# Altium footprint library picoprint_library.PcbLib: 102 footprints (part 3 of 7)
Each footprint in its own frame and in the unit in brackets; x right, y up, seen from the top. Pads: shape width x height; smd on the part's side, far side on the other; paste and mask are expansions set on the pad; w line width, h text height; cw(c..) or ccw(c..) is an arc to the next point about the centre after c.
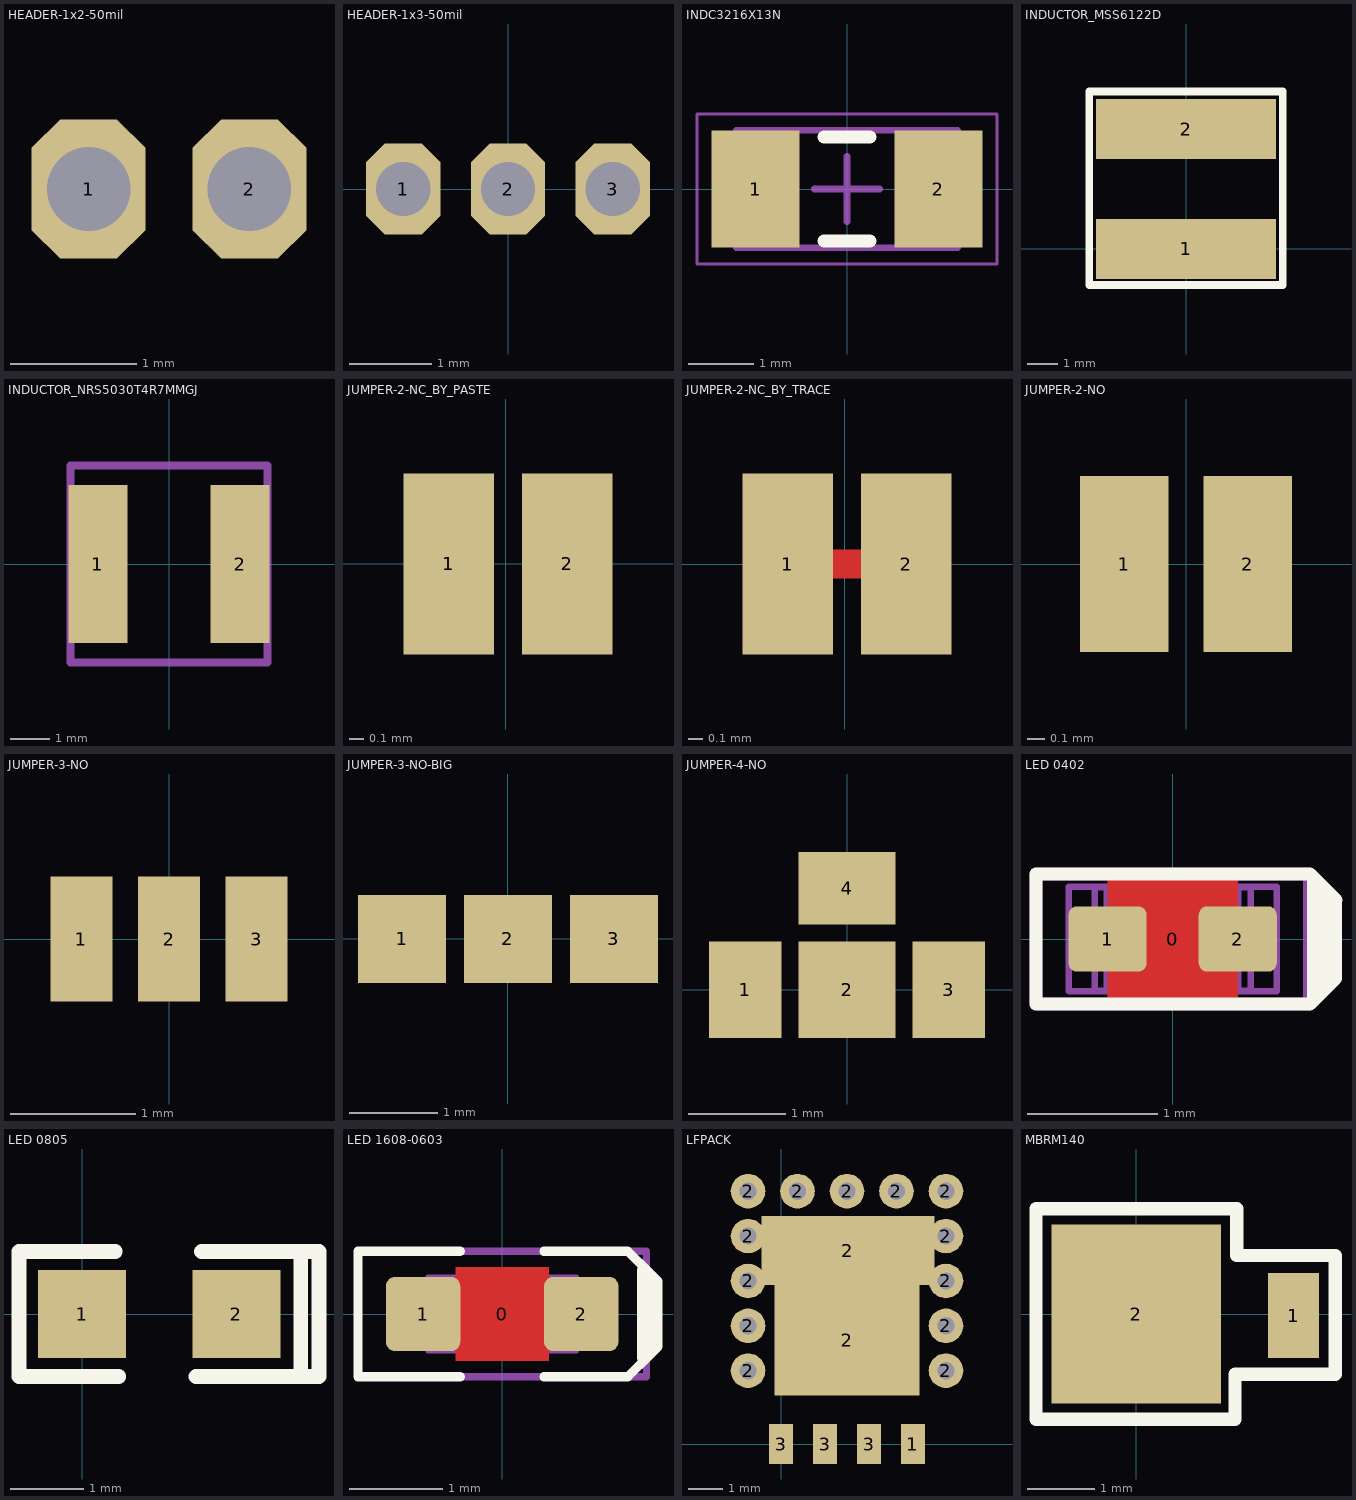
[diagram p2: the footprints below, top view; thin cyan lines are the x and y axes]

## HEADER-1x2-50mil [mm]
pads (2):
  oct 0.9x1.1 hole 0.66: 1(302.26,-308.61) 2(303.53,-308.61)
3D body "User Library-PinHeader1_27_2.STEP": height 5, standoff -2.3, extent 301.625,-309.81 304.165,-307.41

## HEADER-1x3-50mil [mm]
pads (3):
  oct 0.9x1.1 hole 0.66: 1(-1.27,0) 2(0,0) 3(1.27,0)
3D body "User Library-PinHeader1_27_2.STEP": height 5, standoff -2.3, extent -0.635,-1.2 1.905,1.2
3D body "User Library-PinHeader1_27_2.STEP": height 5, standoff -2.3, extent -1.905,-1.2 0.635,1.2

## INDC3216X13N [mm] ", 2-Leads, Body 3.20x1.60mm, IPC Medium Density"
height 1.3
pads (2):
  rect 1.35x1.8 smd: 1(-1.4,0) 2(1.4,0)
Top Overlay:
  lines w0.2: -0.35,-0.8 0.35,-0.8 ; -0.35,0.8 0.35,0.8
Mechanical 13:
  lines w0.1: -1.7,-0.9 -1.7,0.9 1.7,0.9 1.7,-0.9 -1.7,-0.9
Mechanical 15:
  lines w0.05: -2.3,-1.15 -2.3,1.15 2.3,1.15 2.3,-1.15 -2.3,-1.15
  lines w0.1: -0.5,0 0.5,0 ; 0,-0.5 0,0.5
3D body "INDC3216X13N.step": height 0, standoff 0, extent 0,0 0,0
3D body "RES 1206 (3216 metric).STEP": height 0.69, standoff -0.01, extent -1.625,-0.825 1.625,0.825

## INDUCTOR_MSS6122D [mm]
pads (2):
  rect 6x2 smd: 1(0,0) 2(0,4)
Top Overlay:
  lines w0.254: -3.225,-1.2 3.225,-1.2 3.225,5.25 -3.225,5.25 -3.225,-1.2

## INDUCTOR_NRS5030T4R7MMGJ [mm]
height 3.1
pads (2):
  rect 1.5x4 smd: 1(-1.8,0) 2(1.8,0)
Mechanical 13:
  lines w0.2: -2.5,-2.5 -2.5,2.5 2.5,2.5 2.5,-2.5 -2.5,-2.5
3D body "User Library-SMDpowerInductor.step": height 3, standoff 0, extent -2.4,-2.45 2.5,2.45

## JUMPER-2-NC_BY_PASTE [mil]
height 86.61
pads (2):
  rect 25x50 smd: 1(-15.78,0) 2(17,0)
Top Paste:
  rectangle: -40,-40 40,40

## JUMPER-2-NC_BY_TRACE [mil]
height 86.61
pads (2):
  rect 25x50 smd: 1(-15.78,0) 2(17,0)
Top Layer:
  rectangle: -3.94,-3.94 7.87,3.94

## JUMPER-2-NO [mm]
height 2.2
pads (2):
  rect 0.5x1 smd: 1(-0.35,0) 2(0.35,0)
Top Solder:
  rectangle: -0.1,-0.6 0.1,0.6

## JUMPER-3-NO [mm]
height 2.2
pads (3):
  rect 0.5x1 smd: 1(-0.7,0) 2(0,0) 3(0.7,0)

## JUMPER-3-NO-BIG [mm]
height 2.2
pads (3):
  rect 1x1 smd: 1(-1.2,0) 2(0,0) 3(1.2,0)

## JUMPER-4-NO [mm]
height 2.2
pads (4):
  rect 0.75x1 smd: 1(-1.05,0) 3(1.05,0)
  rect 1x1 smd: 2(0,0)
  rect 1x0.75 smd: 4(0,1.05)

## LED 0402 [mm]
pads (3):
  round 0.254 on Mech15: 0(0,0)
  rrect25% 0.6x0.5 smd: 1(-0.5,0) 2(0.5,0)
Top Layer:
  pour cut-out: -0.5,0.5 0.5,0.5 0.5,-0.5 -0.5,-0.5
Top Overlay:
  lines w0.1: 1.081,-0.474 1.081,0.474 1.16,0.395 ; 1.16,-0.36 1.16,0.395 ; 1.25,-0.245 1.25,0.245 1.25,0.305 1.16,0.395 ; 1.25,-0.13 1.25,-0.305 1.055,-0.5 -1.05,-0.5 -1.05,0.5 1.055,0.5 1.255,0.3
Mechanical 13:
  lines w0.05: -0.6,-0.4 -0.6,0.399 0.6,0.4 0.6,-0.4 -0.6,-0.399 ; -0.505,-0.398 -0.505,0.398 ; -0.5,-0.4 -0.8,-0.4 -0.8,0.4 -0.5,0.4 ; 0.5,-0.4 0.8,-0.4 0.8,0.4 0.5,0.4 ; 0.505,-0.398 0.505,0.398 ; -0.599,-0.398 -0.599,0.398 0.599,0.398 0.599,-0.398 -0.599,-0.398
Mechanical 15:
  lines w0.1: -1.05,-0.5 -1.05,0.5 1.05,0.5 1.05,-0.5 -1.05,-0.5
3D body "ChipLedWith-Green.stp": height 0.16, standoff 0, extent -0.502,-0.252 0.502,0.252

## LED 0805 [mm]
pads (2):
  rect 1.2x1.2 smd: 1(0,0) 2(2.1,0)
Top Overlay:
  lines w0.2: 0.45,0.85 -0.86,0.85 -0.86,-0.85 0.5,-0.85 ; 1.55,-0.85 3.225,-0.85 3.225,0.85 1.625,0.85 ; 2.975,-0.85 2.975,0.85
3D body "LED0603red.STEP": height 0.65, standoff 0, extent 0.175,-0.4 1.875,0.4

## LED 1608-0603 [mm]
pads (3):
  round 0.254 on Mech15: 0(0,0)
  rrect25% 0.8x0.8 smd: 1(-0.85,0) 2(0.85,0)
Top Layer:
  pour cut-out: -0.5,0.5 0.5,0.5 0.5,-0.5 -0.5,-0.5
Top Overlay:
  lines w0.1: -0.45,-0.675 -1.55,-0.675 -1.55,0.675 -0.45,0.675 ; 0.45,-0.675 1.35,-0.675 1.58,-0.445 1.58,0.445 1.35,0.675 0.45,0.675 ; 1.501,-0.474 1.501,0.474 ; 1.501,0.524 1.675,0.35 1.675,-0.35 1.525,-0.5
Mechanical 13:
  lines w0.05: -0.6,-0.4 -0.6,0.399 0.6,0.4 0.6,-0.4 -0.6,-0.399 ; -0.505,-0.398 -0.505,0.398 ; -0.5,-0.4 -0.8,-0.4 -0.8,0.4 -0.5,0.4 ; 0.5,-0.4 0.8,-0.4 0.8,0.4 0.5,0.4 ; 0.505,-0.398 0.505,0.398 ; -0.599,-0.398 -0.599,0.398 0.599,0.398 0.599,-0.398 -0.599,-0.398
Mechanical 15:
  lines w0.076: -1.55,-0.675 1.55,-0.675 1.55,0.675 -1.55,0.675 -1.55,-0.675
3D body "LED 0603 APT1608 GREEN.STEP": height 0.75, standoff 0, extent -0.8,-0.4 0.8,0.4

## LFPACK [mm]
pads (19):
  rect 0.7x1.15 smd: 1(3.81,0) 3(0,0) 3(1.27,0) 3(2.54,0)
  round 1 hole 0.5: 2(-0.953,2.12) 2(-0.953,3.416) 2(-0.953,4.711) 2(-0.953,6.007) 2(-0.953,7.302) 2(0.476,7.302) 2(1.905,7.302) 2(3.333,7.302) 2(4.762,2.12) 2(4.762,3.416) 2(4.762,4.711) 2(4.762,6.007) 2(4.762,7.302)
  rect 4.2x3.2 smd: 2(1.905,3)
  rect 5x2 smd: 2(1.93,5.588)
3D body "lfpak.STEP": height 1.1, standoff -0.01, extent -0.58,-0.332 4.42,6.137

## MBRM140 [mm]
pads (2):
  rect 0.762x1.27 smd: 1(2.351,-0.025)
  rect 2.54x2.67 smd: 2(0,0)
Top Overlay:
  lines w0.2: -1.5,-1.575 -1.5,1.575 1.5,1.575 1.5,0.875 2.975,0.875 2.975,-0.9 1.475,-0.9 1.475,-1.575 -1.5,-1.575